# Altium footprint library Reflow3D1411sep.PcbLib: 657 footprints (part 6 of 42)
Each footprint in its own frame and in the unit in brackets; x right, y up, seen from the top. Pads: shape width x height; smd on the part's side, far side on the other; paste and mask are expansions set on the pad; w line width, h text height; cw(c..) or ccw(c..) is an arc to the next point about the centre after c.
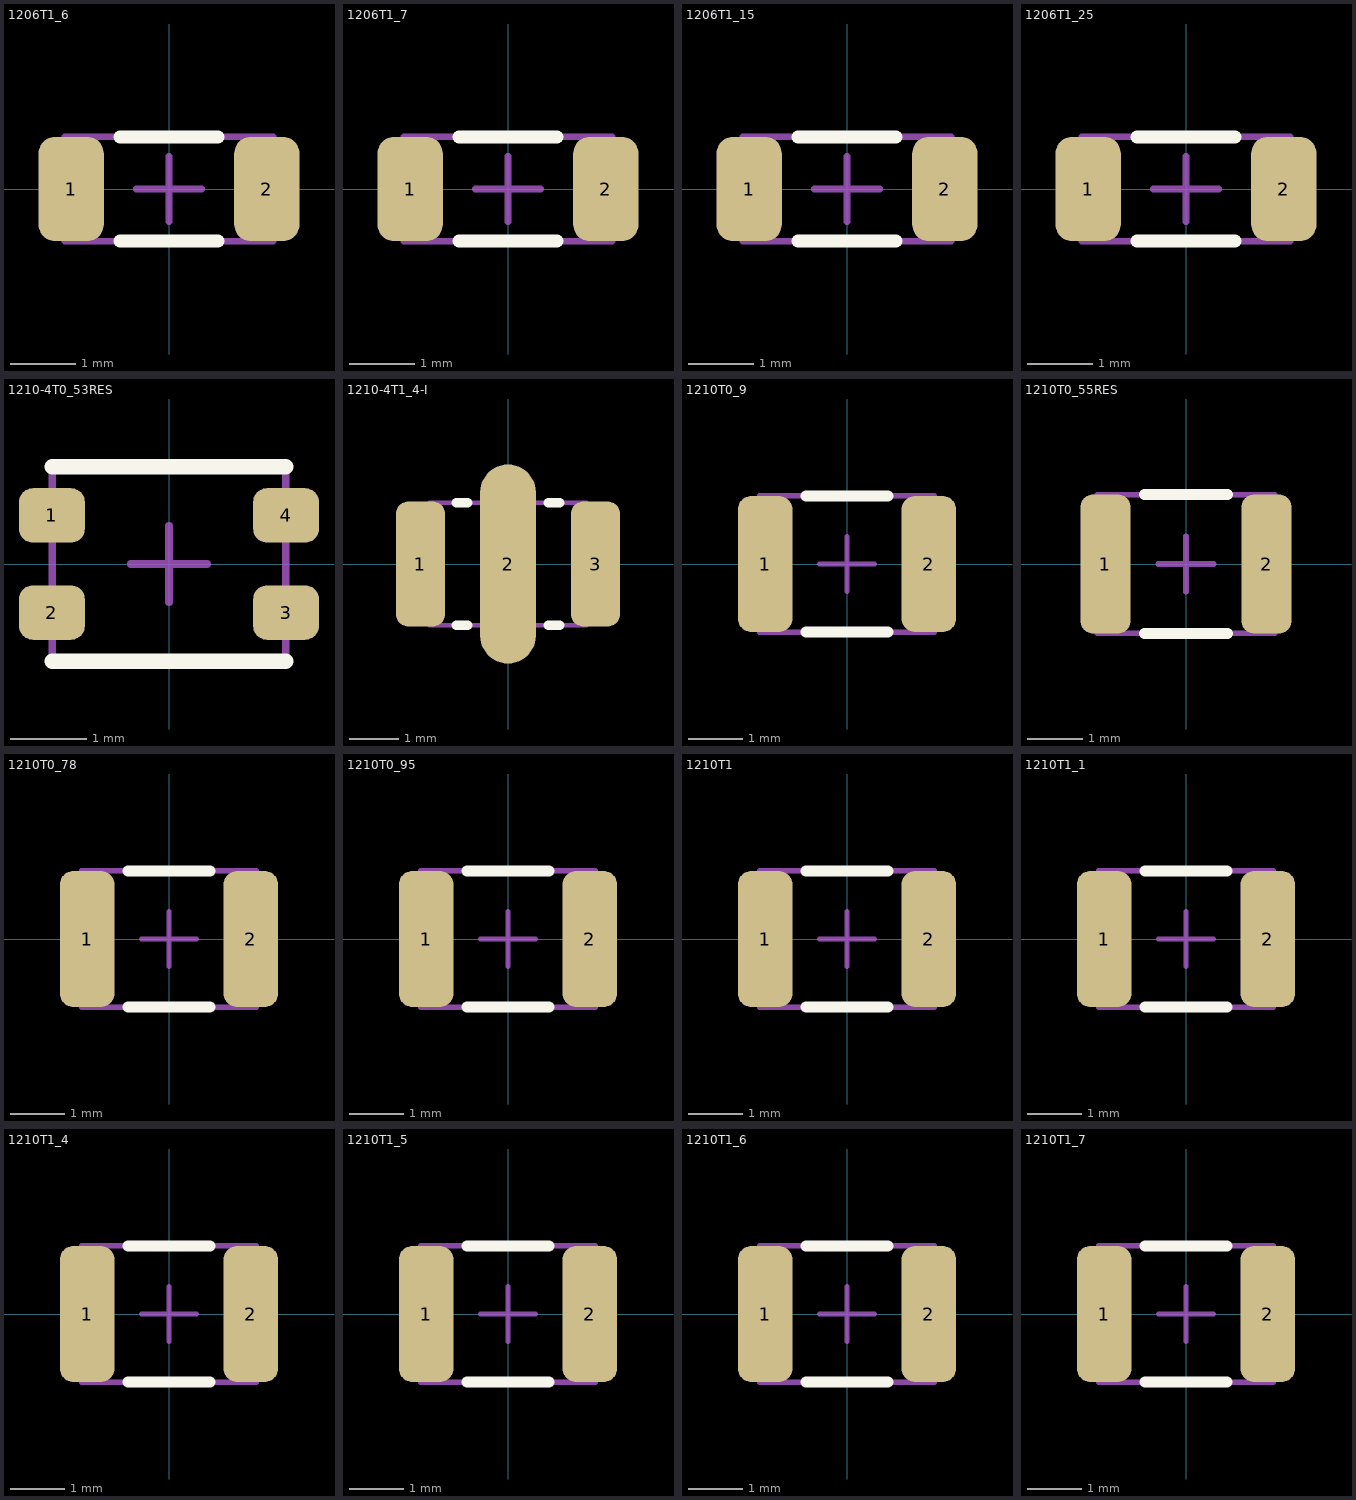
[diagram p5: the footprints below, top view; thin cyan lines are the x and y axes]

## 1206T1_6 [mm] "www.avx.com, smccp.pdf; www.kemet.com, F3102_C0G.pdf"
height 1.6
pads (2):
  rrect50% 1x1.6 smd mask+0.075: 1(-1.5,0) 2(1.5,0)
Top Overlay:
  lines w0.2: -0.75,-0.8 0.75,-0.8 ; -0.75,0.8 0.75,0.8
Mechanical 13:
  lines w0.1: -1.6,-0.8 1.6,-0.8 1.6,0.8 -1.6,0.8 -1.6,-0.8
Mechanical 15:
  lines w0.1: -0.5,0 0.5,0 ; 0,-0.5 0,0.5
3D body: height 1.8, standoff 0, extent -1.7,-0.9 1.7,0.9

## 1206T1_7 [mm] "www.avx.com, smccp.pdf; www.kemet.com, F3102_C0G.pdf"
height 1.7
pads (2):
  rrect50% 1x1.6 smd mask+0.075: 1(-1.5,0) 2(1.5,0)
Top Overlay:
  lines w0.2: -0.75,-0.8 0.75,-0.8 ; -0.75,0.8 0.75,0.8
Mechanical 13:
  lines w0.1: -1.6,-0.8 1.6,-0.8 1.6,0.8 -1.6,0.8 -1.6,-0.8
Mechanical 15:
  lines w0.1: -0.5,0 0.5,0 ; 0,-0.5 0,0.5
3D body: height 1.9, standoff 0, extent -1.7,-0.9 1.7,0.9

## 1206T1_15 [mm] "www.avx.com, smccp.pdf; www.kemet.com, F3102_C0G.pdf"
height 1.15
pads (2):
  rrect50% 1x1.6 smd mask+0.075: 1(-1.5,0) 2(1.5,0)
Top Overlay:
  lines w0.2: -0.75,-0.8 0.75,-0.8 ; -0.75,0.8 0.75,0.8
Mechanical 13:
  lines w0.1: -1.6,-0.8 -1.6,0.8 1.6,0.8 1.6,-0.8 -1.6,-0.8
Mechanical 15:
  lines w0.1: -0.5,0 0.5,0 ; 0,-0.5 0,0.5
3D body: height 1.3, standoff 0, extent -1.7,-0.9 1.7,0.9

## 1206T1_25 [mm] "www.avx.com, smccp.pdf; www.kemet.com, F3102_C0G.pdf"
height 1.25
pads (2):
  rrect50% 1x1.6 smd mask+0.075: 1(-1.5,0) 2(1.5,0)
Top Overlay:
  lines w0.2: -0.75,-0.8 0.75,-0.8 ; -0.75,0.8 0.75,0.8
Mechanical 13:
  lines w0.1: -1.6,-0.8 1.6,-0.8 1.6,0.8 -1.6,0.8 -1.6,-0.8
Mechanical 15:
  lines w0.1: -0.5,0 0.5,0 ; 0,-0.5 0,0.5
3D body: height 1.4, standoff 0, extent -1.7,-0.9 1.7,0.9

## 1210-4T0_53RES [mm] "www.vishay.com, cra12es.pdf, E-Version"
height 0.53
pads (4):
  rrect50% 0.86x0.71 smd mask+0.075: 1(-1.53,0.635) 2(-1.53,-0.635) 3(1.53,-0.635) 4(1.53,0.635)
Top Overlay:
  lines w0.2: -1.525,-1.27 1.525,-1.27 ; -1.525,1.27 1.525,1.27
Mechanical 13:
  lines w0.1: -1.525,-1.27 -1.525,1.27 1.525,1.27 1.525,-1.27 -1.525,-1.27
Mechanical 15:
  lines w0.1: -0.5,0 0.5,0 ; 0,-0.5 0,0.5
3D body: height 0.63, standoff 0, extent -1.6,-1.345 1.6,1.345

## 1210-4T1_4-I [mm] "www.yageo.com, X2Y_series_13.pdf"
height 1.4
pads (3):
  rrect50% 1x2.55 smd mask+0.075: 1(-1.785,0) 3(1.785,0)
  oval 1.14x4.06 smd mask+0.075: 2(0,0)
Top Overlay:
  lines w0.2: -1.05,-1.25 -0.825,-1.25 ; -1.05,1.25 -0.825,1.25 ; 0.825,-1.25 1.05,-1.25 ; 0.825,1.25 1.05,1.25
Mechanical 13:
  lines w0.1: -1.6,-1.25 1.6,-1.25 1.6,1.25 -1.6,1.25 -1.6,-1.25
Mechanical 15:
  lines w0.1: -0.5,0 0.5,0 ; 0,-0.5 0,0.5
3D body: height 1.7, standoff 0, extent -1.7,-1.35 1.7,1.35

## 1210T0_9 [mm] "www.avx.com, smccp.pdf; www.kemet.com, F3102_C0G.pdf"
height 0.9
pads (2):
  rrect50% 1x2.5 smd mask+0.075: 1(-1.5,0) 2(1.5,0)
Top Overlay:
  lines w0.2: -0.75,-1.25 0.75,-1.25 ; -0.75,1.25 0.75,1.25
Mechanical 13:
  lines w0.1: -1.6,-1.25 1.6,-1.25 1.6,1.25 -1.6,1.25 -1.6,-1.25
Mechanical 15:
  lines w0.1: -0.5,0 0.5,0 ; 0,-0.5 0,0.5
3D body: height 1, standoff 0, extent -1.7,-1.35 1.7,1.35

## 1210T0_55RES [mm] "www.vishay.com, dcrcwe3.pdf"
height 0.55
pads (2):
  rrect50% 0.9x2.5 smd mask+0.075: 1(-1.45,0) 2(1.45,0)
Top Overlay:
  lines w0.2: -0.75,-1.25 0.75,-1.25 ; -0.75,1.25 0.75,1.25
Mechanical 13:
  lines w0.1: -1.6,-1.25 -1.6,1.25 1.6,1.25 1.6,-1.25 -1.6,-1.25
Mechanical 15:
  lines w0.1: -0.5,0 0.5,0 ; 0,-0.5 0,0.5
3D body: height 0.6, standoff 0, extent -1.7,-1.35 1.7,1.35

## 1210T0_78 [mm] "www.avx.com, smccp.pdf; www.kemet.com, F3102_C0G.pdf"
height 0.78
pads (2):
  rrect50% 1x2.5 smd mask+0.075: 1(-1.5,0) 2(1.5,0)
Top Overlay:
  lines w0.2: -0.75,-1.25 0.75,-1.25 ; -0.75,1.25 0.75,1.25
Mechanical 13:
  lines w0.1: -1.6,-1.25 -1.6,1.25 1.6,1.25 1.6,-1.25 -1.6,-1.25
Mechanical 15:
  lines w0.1: -0.5,0 0.5,0 ; 0,-0.5 0,0.5
3D body: height 0.88, standoff 0, extent -1.7,-1.35 1.7,1.35

## 1210T0_95 [mm] "www.avx.com, smccp.pdf; www.kemet.com, F3102_C0G.pdf"
height 0.95
pads (2):
  rrect50% 1x2.5 smd mask+0.075: 1(-1.5,0) 2(1.5,0)
Top Overlay:
  lines w0.2: -0.75,-1.25 0.75,-1.25 ; -0.75,1.25 0.75,1.25
Mechanical 13:
  lines w0.1: -1.6,-1.25 -1.6,1.25 1.6,1.25 1.6,-1.25 -1.6,-1.25
Mechanical 15:
  lines w0.1: -0.5,0 0.5,0 ; 0,-0.5 0,0.5
3D body: height 1.05, standoff 0, extent -1.7,-1.35 1.7,1.35

## 1210T1 [mm] "www.avx.com, smccp.pdf; www.kemet.com, F3102_C0G.pdf"
height 1
pads (2):
  rrect50% 1x2.5 smd mask+0.075: 1(-1.5,0) 2(1.5,0)
Top Overlay:
  lines w0.2: -0.75,-1.25 0.75,-1.25 ; -0.75,1.25 0.75,1.25
Mechanical 13:
  lines w0.1: -1.6,-1.25 -1.6,1.25 1.6,1.25 1.6,-1.25 -1.6,-1.25
Mechanical 15:
  lines w0.1: -0.5,0 0.5,0 ; 0,-0.5 0,0.5
3D body: height 1.1, standoff 0, extent -1.7,-1.35 1.7,1.35

## 1210T1_1 [mm] "www.avx.com, smccp.pdf; www.kemet.com, F3102_C0G.pdf"
height 1.1
pads (2):
  rrect50% 1x2.5 smd mask+0.075: 1(-1.5,0) 2(1.5,0)
Top Overlay:
  lines w0.2: -0.75,-1.25 0.75,-1.25 ; -0.75,1.25 0.75,1.25
Mechanical 13:
  lines w0.1: -1.6,-1.25 1.6,-1.25 1.6,1.25 -1.6,1.25 -1.6,-1.25
Mechanical 15:
  lines w0.1: -0.5,0 0.5,0 ; 0,-0.5 0,0.5
3D body: height 1.2, standoff 0, extent -1.7,-1.35 1.7,1.35

## 1210T1_4 [mm] "www.avx.com, smccp.pdf; www.kemet.com, F3102_C0G.pdf"
height 1.4
pads (2):
  rrect50% 1x2.5 smd mask+0.075: 1(-1.5,0) 2(1.5,0)
Top Overlay:
  lines w0.2: -0.75,-1.25 0.75,-1.25 ; -0.75,1.25 0.75,1.25
Mechanical 13:
  lines w0.1: -1.6,-1.25 -1.6,1.25 1.6,1.25 1.6,-1.25 -1.6,-1.25
Mechanical 15:
  lines w0.1: -0.5,0 0.5,0 ; 0,-0.5 0,0.5
3D body: height 1.55, standoff 0, extent -1.7,-1.35 1.7,1.35

## 1210T1_5 [mm] "www.avx.com, smccp.pdf; www.kemet.com, F3102_C0G.pdf"
height 1.5
pads (2):
  rrect50% 1x2.5 smd mask+0.075: 1(-1.5,0) 2(1.5,0)
Top Overlay:
  lines w0.2: -0.75,-1.25 0.75,-1.25 ; -0.75,1.25 0.75,1.25
Mechanical 13:
  lines w0.1: -1.6,-1.25 -1.6,1.25 1.6,1.25 1.6,-1.25 -1.6,-1.25
Mechanical 15:
  lines w0.1: -0.5,0 0.5,0 ; 0,-0.5 0,0.5
3D body: height 1.7, standoff 0, extent -1.7,-1.35 1.7,1.35

## 1210T1_6 [mm] "www.avx.com, smccp.pdf; www.kemet.com, F3102_C0G.pdf"
height 1.6
pads (2):
  rrect50% 1x2.5 smd mask+0.075: 1(-1.5,0) 2(1.5,0)
Top Overlay:
  lines w0.2: -0.75,-1.25 0.75,-1.25 ; -0.75,1.25 0.75,1.25
Mechanical 13:
  lines w0.1: -1.6,-1.25 1.6,-1.25 1.6,1.25 -1.6,1.25 -1.6,-1.25
Mechanical 15:
  lines w0.1: -0.5,0 0.5,0 ; 0,-0.5 0,0.5
3D body: height 1.8, standoff 0, extent -1.7,-1.35 1.7,1.35

## 1210T1_7 [mm] "www.avx.com, smccp.pdf; www.kemet.com, F3102_C0G.pdf"
height 1.7
pads (2):
  rrect50% 1x2.5 smd mask+0.075: 1(-1.5,0) 2(1.5,0)
Top Overlay:
  lines w0.2: -0.75,-1.25 0.75,-1.25 ; -0.75,1.25 0.75,1.25
Mechanical 13:
  lines w0.1: -1.6,-1.25 -1.6,1.25 1.6,1.25 1.6,-1.25 -1.6,-1.25
Mechanical 15:
  lines w0.1: -0.5,0 0.5,0 ; 0,-0.5 0,0.5
3D body: height 1.9, standoff 0, extent -1.7,-1.35 1.7,1.35